# Altium schematic symbol library SCHLIB.SchLib: 2608 symbols (part 6 of 20) (continued)
## IC-OPA547F/500 (continued)
IC OPAMP GP 1MHZ DDPAK; Manufacturer: Texas Instruments; Manufacturer Part Number: OPA547F/500; Slew Rate: 6V/µs; Common Mode Rejection Ratio: 80dB; Max Supply Voltage: 60V; Min Supply Voltage: 8V; Min Dual Supply Voltage: 4V; Max Dual Supply Voltage: 30V; Number of Channels: 1; Output Current: 2A; Nominal Supply Current: 15mA; Voltage Gain: 115dB; Input Bias Current: 500nA; Input Offset Voltage (Vos): 5mV; Operating Supply Current: 10mA; Output Current per Channel: 750mA; Washability: OK; Supplier 1: Digi-Key; Stock 1: 5920; Pricing 1: 1 = 10.94000, 10 = 10.05900, 100 = 8.49520 (USD); RoHS: Yes; Mount: Surface Mount; Case/Package: TO-263; Number of Pins: 7; Contact Plating: Tin; Min Operating Temperature: -40°C; Max Operating Temperature: 85°C; Packaging: Tape and Reel; Bandwidth: 1MHz; Unity Gain Bandwidth Product: 1MHz; Package Quantity: 500; Operating Supply Voltage: 30V; Number of Circuits: 1; Gain Bandwidth Product: 1MHz; Number of Amplifiers: 1; Number of Elements: 1; Radiation Hardening: No; REACH SVHC: No SVHC; Lead Free: Lead Free; ComponentLink1URL: https://datasheet.ciiva.com/27052/1489792-27052286.pdf?src-supplier=Jameco; ComponentLink1Description: https://datasheet.ciiva.com/27052/1489792-27052286.pdf?src-supplier=Jameco; ComponentLink2URL: https://datasheet.ciiva.com/26855/opa547f-500-26855194.pdf?src-supplier=IIIC; ComponentLink2Description: https://datasheet.ciiva.com/26855/opa547f-500-26855194.pdf?src-supplier=IIIC; ComponentLink3URL: https://datasheet.ciiva.com/2974/opa547-2974080.pdf?src-supplier=Avnet; ComponentLink3Description: https://datasheet.ciiva.com/2974/opa547-2974080.pdf?src-supplier=Avnet; ComponentLink4URL: https://datasheet.ciiva.com/1800/opa547-1800437.pdf?src-supplier=Digi-Key; ComponentLink4Description: https://datasheet.ciiva.com/1800/opa547-1800437.pdf?src-supplier=Digi-Key; ComponentLink5URL: https://datasheet.ciiva.com/7738/80314-7738453.pdf?src-supplier=Element14; ComponentLink5Description: https://datasheet.ciiva.com/7738/80314-7738453.pdf?src-supplier=Element14; ComponentLink6URL: https://datasheet.ciiva.com/1800/opa547-1800438.pdf?src-supplier=Digi-Key; ComponentLink6Description: https://datasheet.ciiva.com/1800/opa547-1800438.pdf?src-supplier=Digi-Key; ComponentLink7URL: https://datasheet.ciiva.com/46391/80314-46391966.pdf?src-supplier=Element14; ComponentLink7Description: https://datasheet.ciiva.com/46391/80314-46391966.pdf?src-supplier=Element14; ComponentLink8URL: https://datasheet.ciiva.com/1800/opa547-1800436.pdf?src-supplier=Digi-Key; ComponentLink8Description: https://datasheet.ciiva.com/1800/opa547-1800436.pdf?src-supplier=Digi-Key; Supplier Part Number 1: 296-26289-1-ND
footprint TO-263-8
pins: 1 VIN+, 2 VIN-, 3 ILIM, 4 V-, 5 V+, 6 VO, 7 E/S, 8 EPAD

## IC-PCA82C251T/YM,118
designator U?, comment PCA82C251  Case/Package: SOIC8
IC TXRX CAN 24V 8SOIC; Manufacturer: NXP Semiconductors; Manufacturer Part Number: PCA82C251T/YM,118; Min Supply Voltage: 4.5V; Max Supply Voltage: 5.5V; Number of Transmit Buffers: 1; Interface: CAN,Serial; Nominal Supply Current: 85mA; Watchdog Timer: No; Reset: Active Low; Operating Supply Current: 2.4uA; Threshold Voltage: 405mV; Propagation Delay: 225ns; Operating Supply Voltage: 5V; Logic Function: Demultiplexer,Decoder; Number of Outputs: 8; Number of Inputs: 3; Power Dissipation: 320mW; High Level Output Current: -5.2mA; Low Level Output Current: 5.2mA; Polarity: Inverting; Supply Type: Single; Bandwidth: 28MHz; Washability: OK; Supplier 1: Digi-Key; Stock 1: 44107; Pricing 1: 1=1.82, 10=1.631, 100=1.3109, 500=1.077, 1000=0.89237 (USD); Mount: Surface Mount; Number of Pins: 8; Contact Plating: Gold; Min Operating Temperature: -40°C; Max Operating Temperature: 125°C; Packaging: Tape and Reel; Number of Receive Buffers: 1; Number of Transceivers: 1; Package Quantity: 2500; Max Supply Current: 85mA; Radiation Hardening: No; REACH SVHC: No SVHC; Lead Free: Lead Free; ComponentLink1URL: http://www.farnell.com/datasheets/1506298.pdf; ComponentLink1Description: http://www.farnell.com/datasheets/1506298.pdf; ComponentLink2URL: http://www.nxp.com/documents/data_sheet/PCA82C251.pdf; ComponentLink2Description: http://www.nxp.com/documents/data_sheet/PCA82C251.pdf; Supplier Part Number 1: 568-8673-6-ND; RoHS: Yes; Number of Voltages Monitored: 1; Number of Elements: 1; Quiescent Current: 2.4uA; ComponentLink3URL: https://datasheet.ciiva.com/15105/getdatasheetpartid-203815-15105984.pdf?src-supplier=Verical; ComponentLink3Description: https://datasheet.ciiva.com/15105/getdatasheetpartid-203815-15105984.pdf?src-supplier=Verical; ComponentLink4URL: https://datasheet.ciiva.com/23940/1764404-23940257.pdf?src-supplier=Newark; ComponentLink4Description: https://datasheet.ciiva.com/23940/1764404-23940257.pdf?src-supplier=Newark; ComponentLink5URL: https://datasheet.ciiva.com/27052/1523276-27052317.pdf?src-supplier=Jameco; ComponentLink5Description: https://datasheet.ciiva.com/27052/1523276-27052317.pdf?src-supplier=Jameco; ComponentLink6URL: https://datasheet.ciiva.com/1970/tps3808g01-1970903.pdf?src-supplier=Digi-Key; ComponentLink6Description: https://datasheet.ciiva.com/1970/tps3808g01-1970903.pdf?src-supplier=Digi-Key; ComponentLink7URL: https://datasheet.ciiva.com/1970/tps3808g01-1970904.pdf?src-supplier=Digi-Key; ComponentLink7Description: https://datasheet.ciiva.com/1970/tps3808g01-1970904.pdf?src-supplier=Digi-Key; ComponentLink8URL: https://datasheet.ciiva.com/1970/tps3808g01-1970905.pdf?src-supplier=Digi-Key; ComponentLink8Description: https://datasheet.ciiva.com/1970/tps3808g01-1970905.pdf?src-supplier=Digi-Key; ComponentLink9URL: https://datasheet.ciiva.com/7990/1849917-7990457.pdf?src-supplier=Element14; ComponentLink9Description: https://datasheet.ciiva.com/7990/1849917-7990457.pdf?src-supplier=Element14; ComponentLink10URL: https://datasheet.ciiva.com/14207/tps3808g01-14207033.pdf?src-supplier=Avnet; ComponentLink10Description: https://datasheet.ciiva.com/14207/tps3808g01-14207033.pdf?src-supplier=Avnet; ComponentLink11URL: https://datasheet.ciiva.com/14207/tps3808g01-14207034.pdf?src-supplier=Avnet; ComponentLink11Description: https://datasheet.ciiva.com/14207/tps3808g01-14207034.pdf?src-supplier=Avnet; ComponentLink12URL: https://datasheet.ciiva.com/26072/tps3808g01-26072362.pdf?src-supplier=Avnet+Europe; ComponentLink12Description: https://datasheet.ciiva.com/26072/tps3808g01-26072362.pdf?src-supplier=Avnet+Europe; ComponentLink13URL: https://datasheet.ciiva.com/5695/1633687-5695915.pdf?src-supplier=Farnell; ComponentLink13Description: https://datasheet.ciiva.com/5695/1633687-5695915.pdf?src-supplier=Farnell; ComponentLink14URL: https://datasheet.ciiva.com/28475/1882049-28475133.pdf?src-supplier=Element14; ComponentLink14Description: https://datasheet.ciiva.com/28475/1882049-28475133.pdf?src-supplier=Element14; Weight: 0.002183oz; Number of Input Lines: 3; Number of Output Lines: 8; Turn-On Delay Time: 225ns; Number of Circuits: 1; Number of Bits: 8; Independent Circuits: 1; Number of Channels: 1; ComponentLink15URL: https://datasheet.ciiva.com/14292/sn74hc138-14292869.pdf?src-supplier=Avnet; ComponentLink15Description: https://datasheet.ciiva.com/14292/sn74hc138-14292869.pdf?src-supplier=Avnet; ComponentLink16URL: https://datasheet.ciiva.com/1888/sn74hc138-1888631.pdf?src-supplier=Digi-Key; ComponentLink16Description: https://datasheet.ciiva.com/1888/sn74hc138-1888631.pdf?src-supplier=Digi-Key; ComponentLink17URL: https://datasheet.ciiva.com/26259/sn54hc138-sp-26259623.pdf?src-supplier=Avnet+Europe; ComponentLink17Description: https://datasheet.ciiva.com/26259/sn54hc138-sp-26259623.pdf?src-supplier=Avnet+Europe; ComponentLink18URL: https://datasheet.ciiva.com/1888/sn74hc138-1888632.pdf?src-supplier=Digi-Key; ComponentLink18Description: https://datasheet.ciiva.com/1888/sn74hc138-1888632.pdf?src-supplier=Digi-Key; ComponentLink19URL: https://datasheet.ciiva.com/1888/sn74hc138-1888633.pdf?src-supplier=Digi-Key; ComponentLink19Description: https://datasheet.ciiva.com/1888/sn74hc138-1888633.pdf?src-supplier=Digi-Key; ComponentLink20URL: https://datasheet.ciiva.com/46393/1885857-46393964.pdf?src-supplier=Element14; ComponentLink20Description: https://datasheet.ciiva.com/46393/1885857-46393964.pdf?src-supplier=Element14; ComponentLink21URL: https://datasheet.ciiva.com/46394/1885857-46394029.pdf?src-supplier=Element14; ComponentLink21Description: https://datasheet.ciiva.com/46394/1885857-46394029.pdf?src-supplier=Element14
footprint SOIC8
pins: 1 TX (in), 2 GND (power), 3 VCC (power), 4 RX (out), 5 LBK (out), 6 CANL (io), 7 CANH (io), 8 RS (in)

## IC-PCA6416APW,118
designator U?, comment PCA6416
IC I/O EXPANDER I2C/SMB 24TSSOP; Manufacturer 1: NXP Semiconductors; Manufacturer Part Number 1: PCA6416APW,118; Number of Channels: 1; Operating Supply Voltage: 5.5V; Nominal Supply Current: 200mA; Output Current: 10mA; Interface: I2C,SMBus; Max Frequency: 100kHz; Frequency: 400kHz; Number of I/Os: 16; Washability: OK; Supplier 1: Digi-Key; Stock 1: 1659; Pricing 1: 1=1,37000, 10=1,22800, 100=0,89470, 500=0,74902, 1000=0,58257 (USD); RoHS: Yes; Mount: Surface Mount; Case/Package: TSSOP; Number of Pins: 24; Weight: 0.007478oz; Min Operating Temperature: -40°C; Max Operating Temperature: 85°C; Packaging: Tape and Reel; Package Quantity: 1; Operating Supply Current: 200mA; Lead Free: Lead Free; ComponentLink1URL: https://datasheet.ciiva.com/16297/pca6416a-16297873.pdf?src-supplier=Future+Electronics; ComponentLink1Description: https://datasheet.ciiva.com/16297/pca6416a-16297873.pdf?src-supplier=Future+Electronics; ComponentLink2URL: https://datasheet.ciiva.com/12097/pca6416a-211613-12097269.pdf?src-supplier=Mouser; ComponentLink2Description: https://datasheet.ciiva.com/12097/pca6416a-211613-12097269.pdf?src-supplier=Mouser; ComponentLink3URL: https://datasheet.ciiva.com/6633/pca6416a-6633197.pdf?src-supplier=Digi-Key; ComponentLink3Description: https://datasheet.ciiva.com/6633/pca6416a-6633197.pdf?src-supplier=Digi-Key; ComponentLink4URL: https://datasheet.ciiva.com/6633/pca6416a-6633198.pdf?src-supplier=Digi-Key; ComponentLink4Description: https://datasheet.ciiva.com/6633/pca6416a-6633198.pdf?src-supplier=Digi-Key; ComponentLink5URL: https://datasheet.ciiva.com/6633/pca6416a-6633199.pdf?src-supplier=Digi-Key; ComponentLink5Description: https://datasheet.ciiva.com/6633/pca6416a-6633199.pdf?src-supplier=Digi-Key; Supplier Part Number 1: 568-9911-1-ND
footprint TSSOP24 - NOEP
pins: 1 ~{INT} (out), 2 VCCI (power), 3 ~{RST} (in), 4 P00 (io), 5 P01 (io), 6 P02 (io), 7 P03 (io), 8 P04 (io), 9 P05 (io), 10 P06 (io), 11 P07 (io), 12 GND (power), 13 P10 (io), 14 P11 (io), 15 P12 (io), 16 P13 (io), 17 P14 (io), 18 P15 (io), 19 P16 (io), 20 P17 (io), 21 A0 (in), 22 SCL (in), 23 SDA (io), 24 VCCO (power)

## IC-PCA9672BS,118
designator U?, comment PCA9672
IC I/O EXPANDER 8BIT 16-HVQFN; Manufacturer: NXP Semiconductors; Manufacturer Part Number: PCA9672BS,118; Frequency: 1MHz; Operating Supply Voltage: 5.5V; Number of I/Os: 8; Interface: I2C,Serial; Output Current: 43mA; Supplier 1: Digi-Key; Supplier Part Number 1: 568-4194-1-ND; Stock: 3044; Pricing: 1=1.5, 10=1.349, 25=1.2724, 100=1.018, 250=0.8908, 500=0.8653, 1000=0.6872, 2500=0.6617 (USD); RoHS: Yes; Mount: Surface Mount; Min Operating Temperature: -40°C; Max Operating Temperature: 85°C; Max Frequency: 1MHz; Package Quantity: 1; Packaging: Tape and Reel; Lead Free: Lead Free; ComponentLink1URL: https://datasheet.ciiva.com/1780/pca9672-1780034.pdf?src-supplier=Digi-Key; ComponentLink1Description: https://datasheet.ciiva.com/1780/pca9672-1780034.pdf?src-supplier=Digi-Key; ComponentLink2URL: https://datasheet.ciiva.com/1780/pca9672-1780035.pdf?src-supplier=Digi-Key; ComponentLink2Description: https://datasheet.ciiva.com/1780/pca9672-1780035.pdf?src-supplier=Digi-Key; ComponentLink3URL: https://datasheet.ciiva.com/1780/pca9672-1780036.pdf?src-supplier=Digi-Key; ComponentLink3Description: https://datasheet.ciiva.com/1780/pca9672-1780036.pdf?src-supplier=Digi-Key
footprint 16-HVQFN (QFN, 16-Leads, Body 3x3mm, Pitch 0.5mm, Thermal Pad 1.5x1.5mm, IPC High Density)
pins: 1 ~{RESET}, 2 P0, 3 P1, 4 P2, 5 P3, 6 VSS, 7 P4, 8 P5, 9 P6, 10 P7, 11 ~{INT}, 12 SCL, 13 SDA, 14 VDD, 15 AD0, 16 AD1

## IC-PCAL6524HEAZ
designator U?, comment PCAL6524
IC EXPANDER 24B 32HUQFN; Manufacturer: NXP Semiconductors; Manufacturer Part Number: PCAL6524HEAZ; Number of I/Os: 24; Interface: I2C,SMBus; Frequency: 1MHz; Min Supply Voltage: 800mV; Max Supply Voltage: 5.5V; Washability: OK; Supplier 1: Mouser; Stock 1: 4138; Pricing 1: 1=2,01000, 10=1,69000, 100=1,18000, 500=1,12000, 1000=0,89100, 2500=0,85800 (USD); RoHS: Yes; Mount: Surface Mount; Number of Pins: 32; Min Operating Temperature: -40°C; Max Operating Temperature: 85°C; Packaging: Cut Tape; REACH SVHC: No SVHC; ComponentLink1URL: http://www.mouser.com/ds/2/302/PCAL6524-841781.pdf?src-supplier=Mouser; ComponentLink1Description: http://www.mouser.com/ds/2/302/PCAL6524-841781.pdf?src-supplier=Mouser; ComponentLink2URL: http://www.farnell.com/datasheets/2057129.pdf?src-supplier=Farnell; ComponentLink2Description: http://www.farnell.com/datasheets/2057129.pdf?src-supplier=Farnell; ComponentLink3URL: http://www.farnell.com/datasheets/2057129.pdf?src-supplier=Element14; ComponentLink3Description: http://www.farnell.com/datasheets/2057129.pdf?src-supplier=Element14; ComponentLink4URL: https://www.nxp.com/docs/en/data-sheet/PCAL6524.pdf?src-supplier=Digi-Key; ComponentLink4Description: https://www.nxp.com/docs/en/data-sheet/PCAL6524.pdf?src-supplier=Digi-Key; ComponentLink5URL: http://www.farnell.com/datasheets/2057129.pdf?src-supplier=Newark; ComponentLink5Description: http://www.farnell.com/datasheets/2057129.pdf?src-supplier=Newark; Supplier Part Number 1: 771-PCAL6524HEAZ
footprint FP-SOT1426-1-MFG
pins: 1 P0 0 (io), 2 P0 1 (io), 3 P0 2 (io), 4 P0 3 (io), 5 P0 4 (io), 6 P0 5 (io), 7 P0 6 (io), 8 P0 7 (io), 9 P1 0 (io), 10 P1 1 (io), 11 P1 2 (io), 12 P1 3 (io), 13 P1 4 (io), 14 P1 5 (io), 15 P1 6 (io), 16 P1 7 (io), 17 P2 0 (io), 18 P2 1 (io), 19 P2 2 (io), 20 P2 3 (io), 21 P2 4 (io), 22 P2 5 (io), 23 P2 6 (io), 24 P2 7 (io), 25 VSS (power), 26 ADDR (in), 27 VDD(P) (power), 28 ~{RESET} (in), 29 SCL (in), 30 SDA (io), 31 VDD(I2C-bus) (power), 32 ~{INT} (out), 33 EP (power)

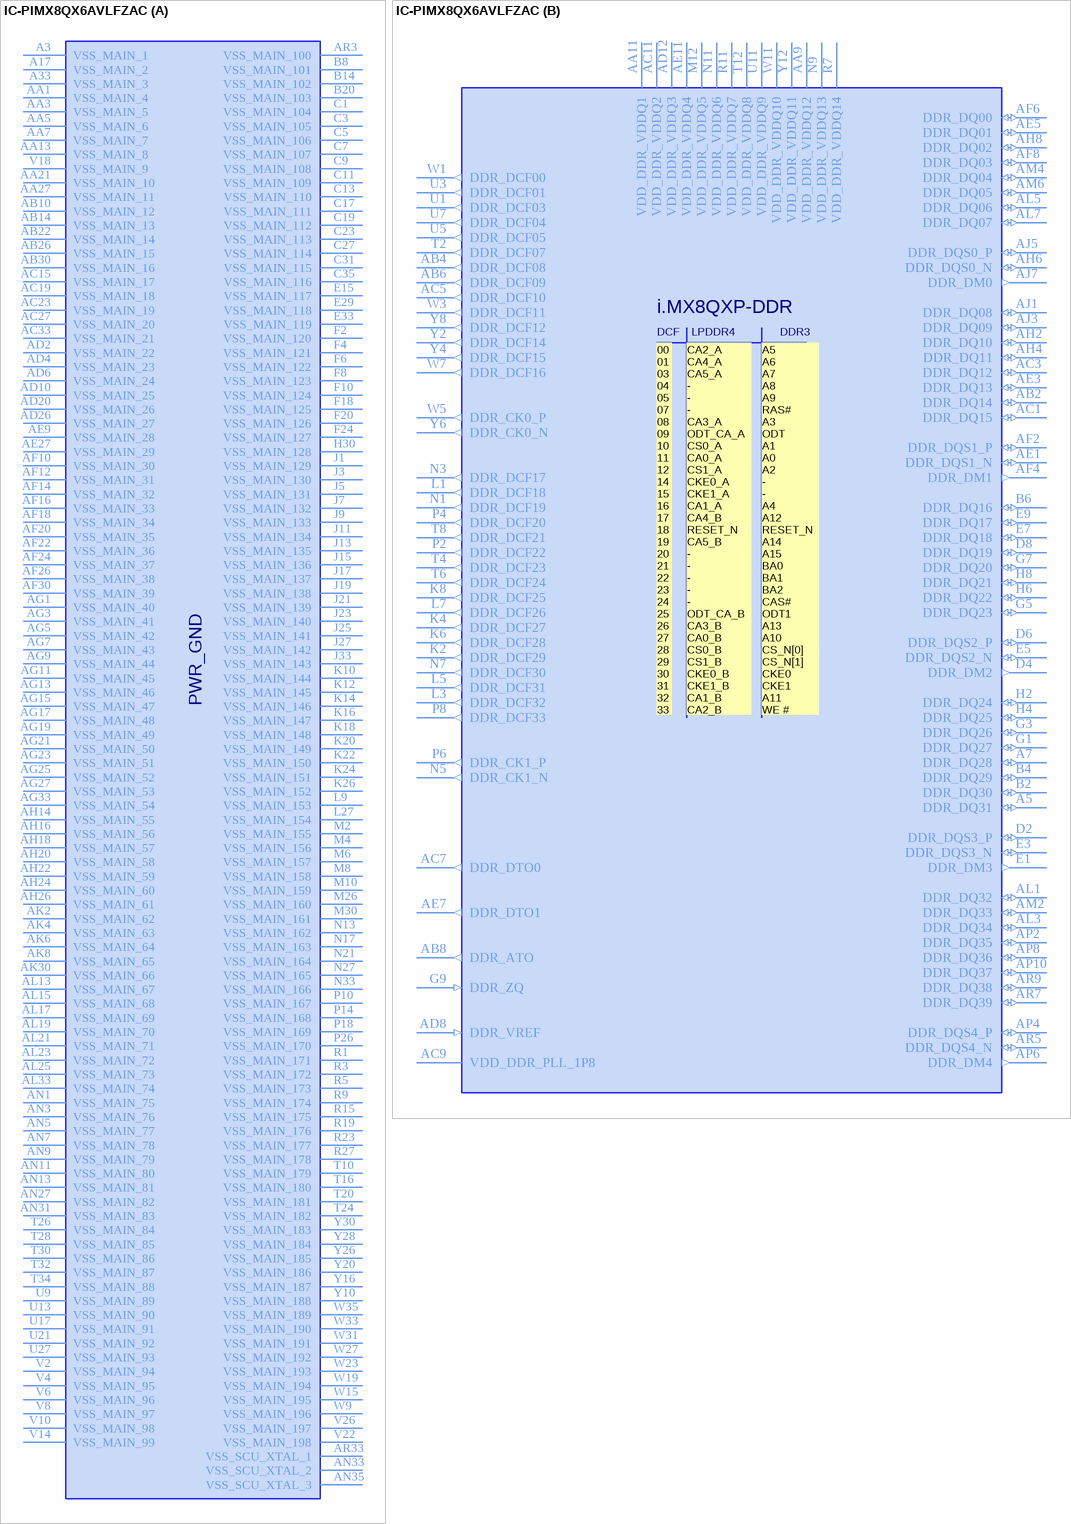
[diagram p23: symbol IC-PIMX8QX6AVLFZAC]

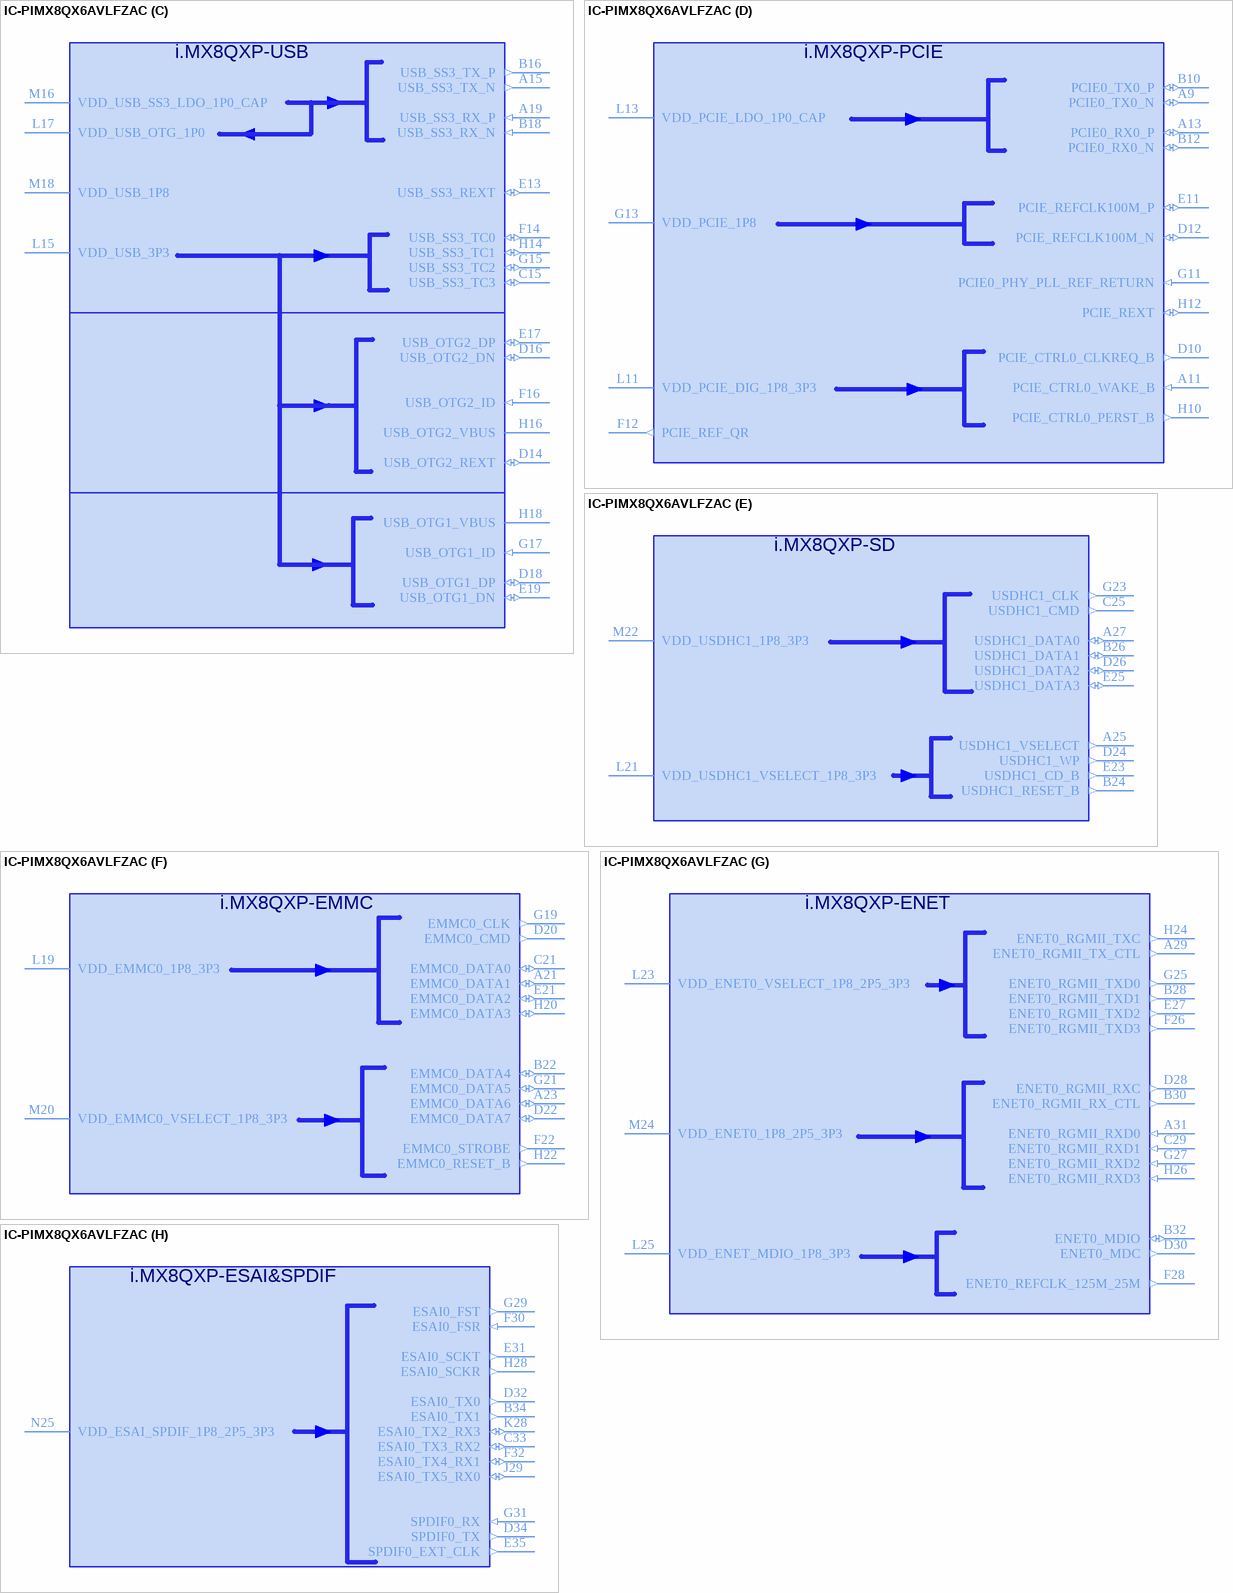
[diagram p24: symbol IC-PIMX8QX6AVLFZAC]

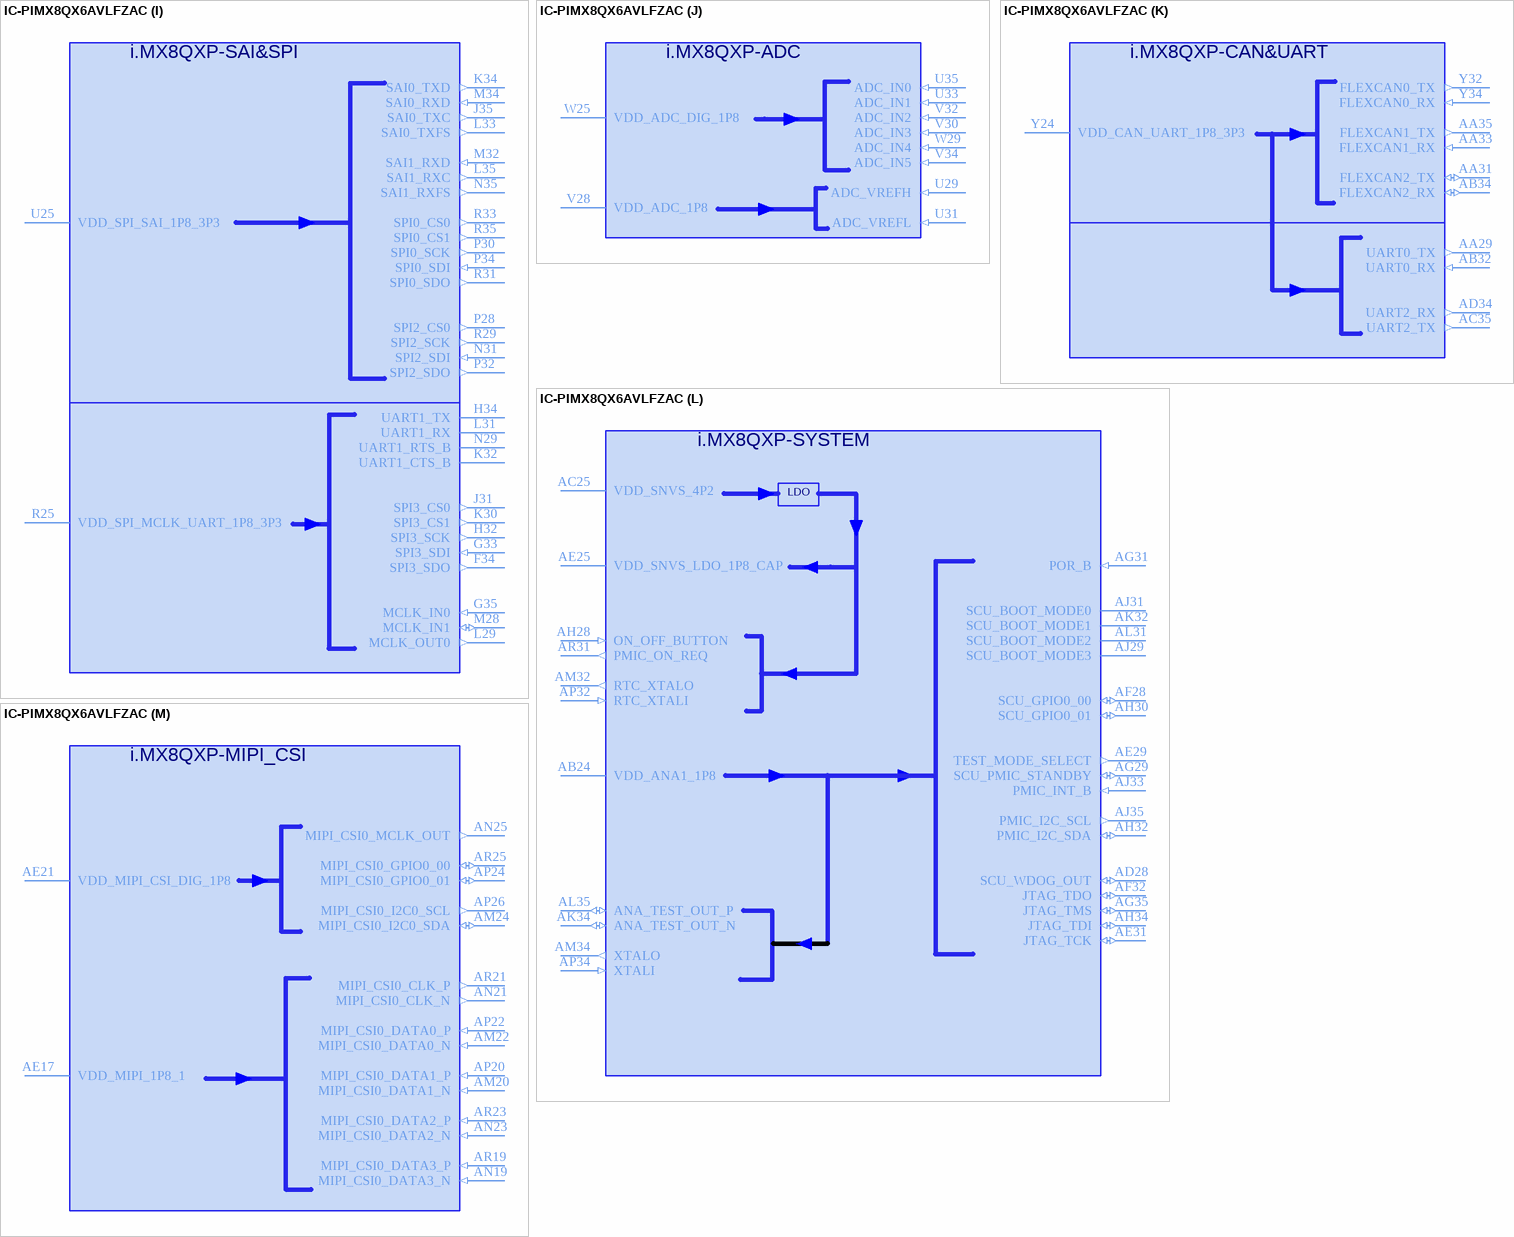
[diagram p25: symbol IC-PIMX8QX6AVLFZAC]

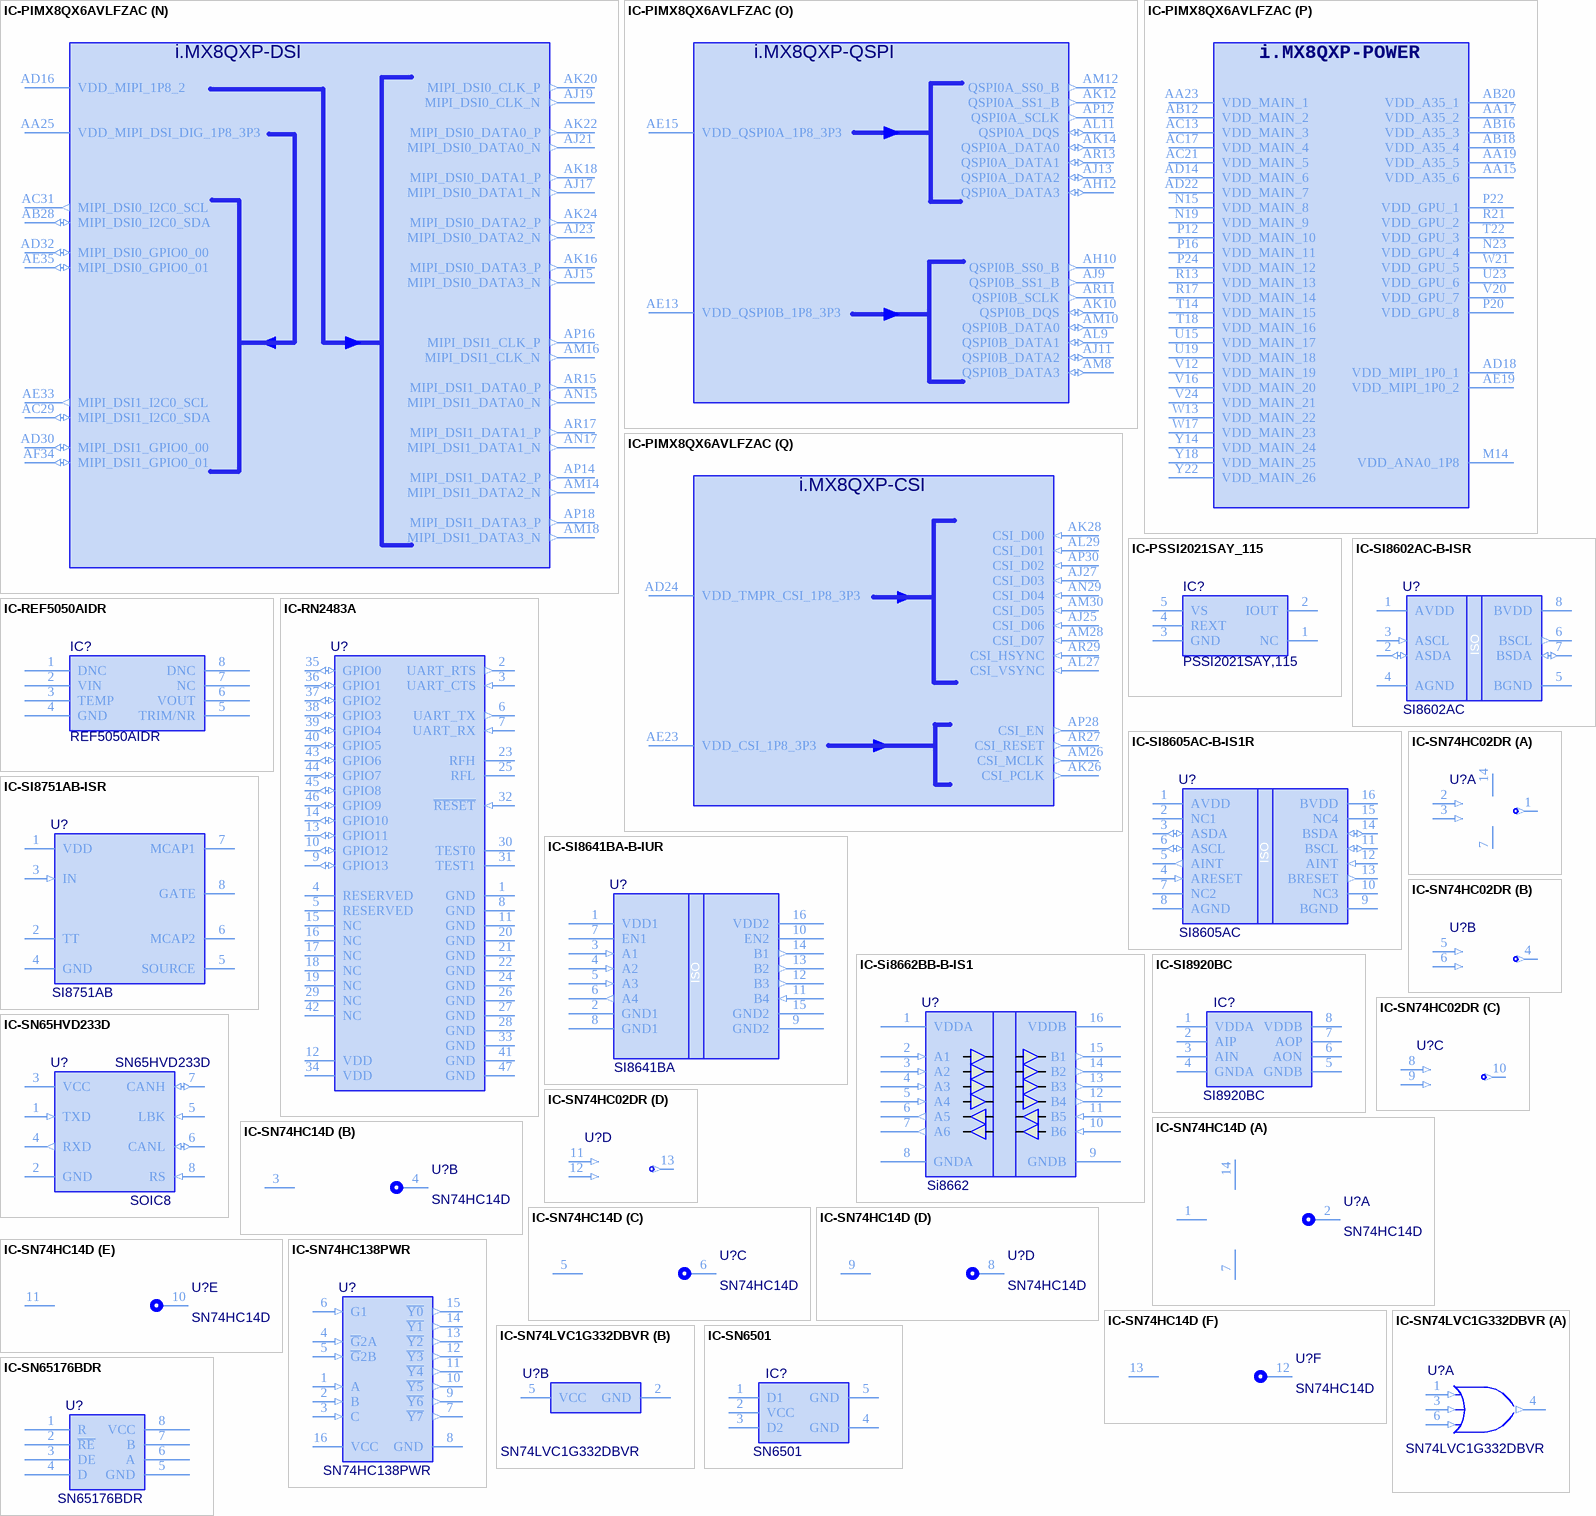
[diagram p26: symbols IC-PIMX8QX6AVLFZAC to IC-SN65176BDR]